# Altium footprint library PcbLib.PcbLib: 16 footprints
Each footprint in its own frame and in the unit in brackets; x right, y up, seen from the top. Pads: shape width x height; smd on the part's side, far side on the other; paste and mask are expansions set on the pad; w line width, h text height; cw(c..) or ccw(c..) is an arc to the next point about the centre after c.
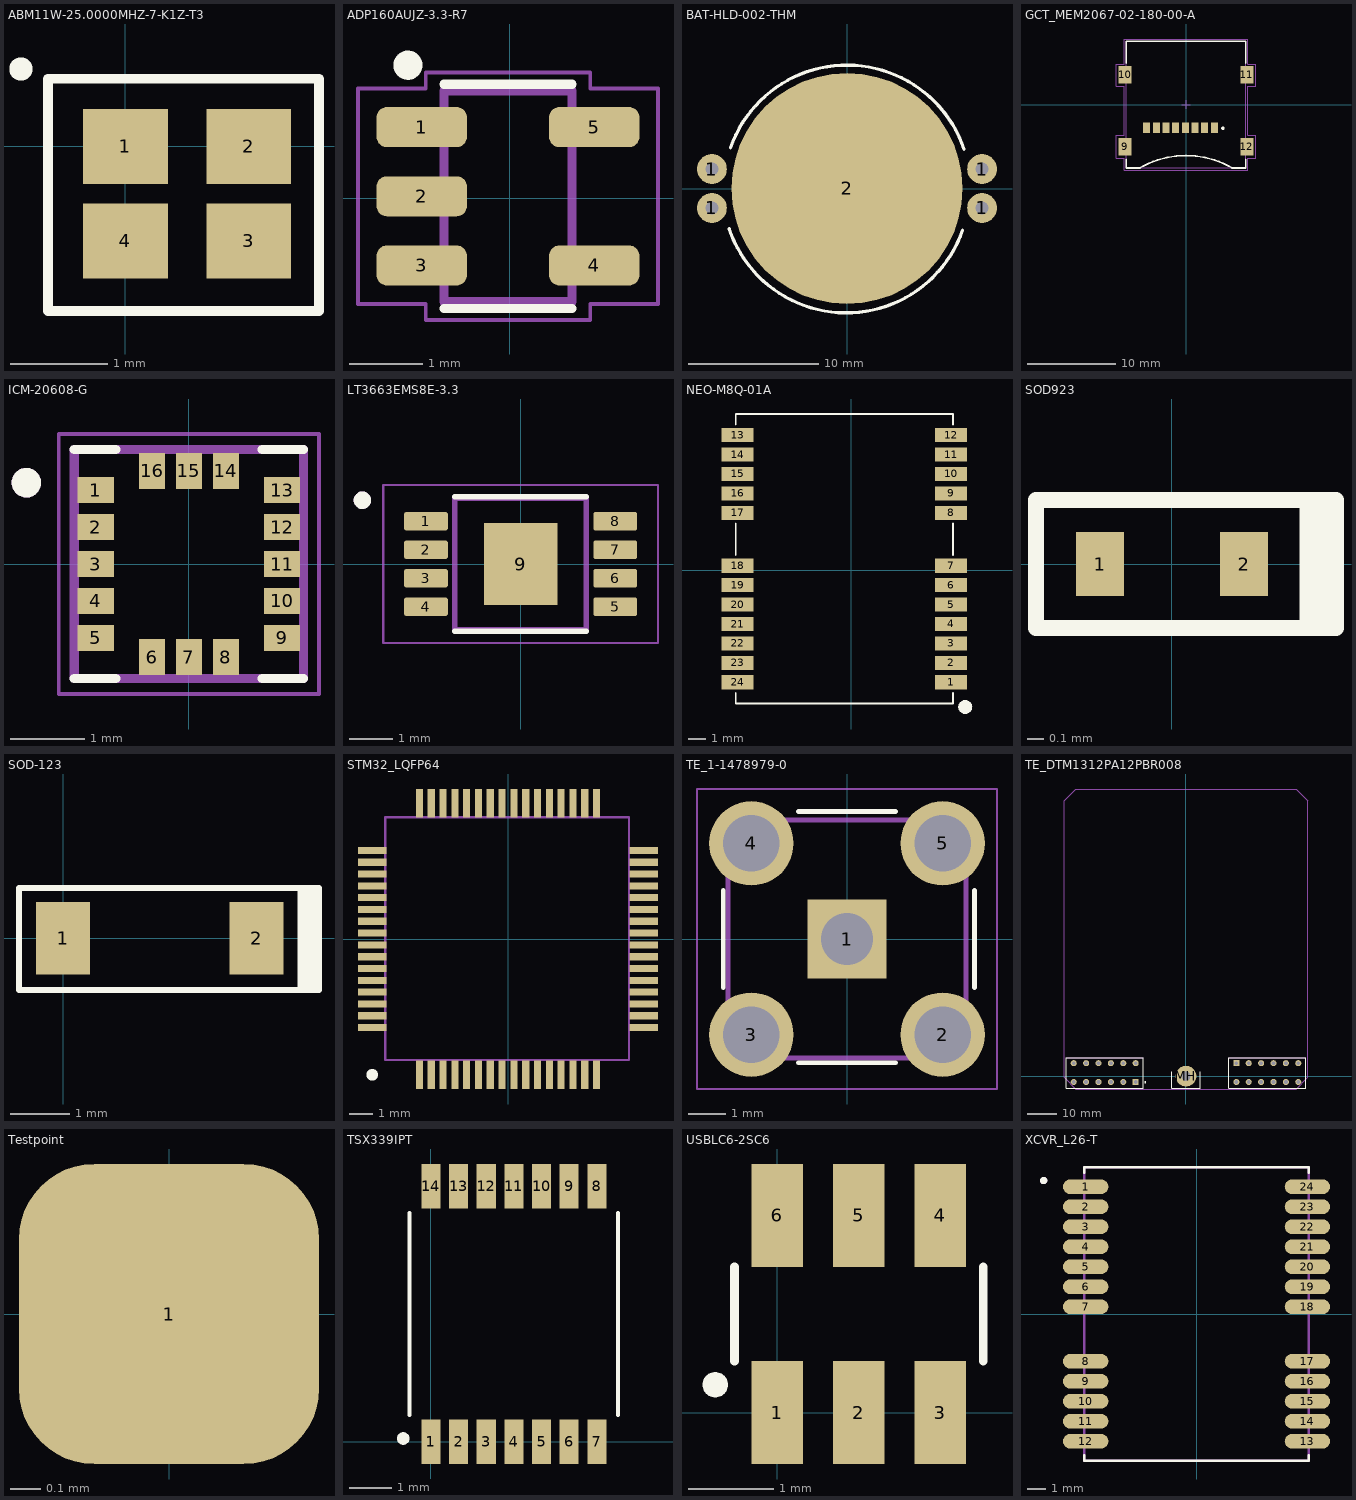
[diagram p0: the footprints below, top view; thin cyan lines are the x and y axes]

## ABM11W-25.0000MHZ-7-K1Z-T3 [mm] "Crystal"
pads (4):
  rect 0.875x0.775 smd: 1(0,0) 2(1.275,0) 3(1.275,-0.975) 4(0,-0.975)
Top Overlay:
  circle w0.2: c-1.08,0.8 r0.02
  lines w0.1: -0.8,-1.7 2,-1.7 2,0.7 -0.8,0.7 -0.8,-1.7

## ADP160AUJZ-3.3-R7 [mm] "Linear Voltage Regulator"
pads (5):
  rrect50% 1.24x0.55 smd: 1(-1.21,0.975) 2(-1.21,0.025) 3(-1.21,-0.925) 4(1.16,-0.925) 5(1.16,0.975)
Top Overlay:
  circle w0.2: c-1.4,1.825 r0.1
  lines w0.127: -0.905,-1.515 0.855,-1.515 ; -0.905,1.565 0.855,1.565
Mechanical 13:
  lines w0.127: -0.905,-1.425 -0.905,1.475 0.855,1.475 0.855,-1.425 -0.905,-1.425
Mechanical 15:
  lines w0.05: -2.085,-1.455 -1.155,-1.455 -1.155,-1.675 1.105,-1.675 1.105,-1.455 2.035,-1.455 2.035,1.505 1.105,1.505 1.105,1.725 -1.155,1.725 -1.155,1.505 -2.085,1.505 -2.085,-1.455
3D body "step_temp.STEP": height 0.85, standoff -0.15, extent -1.425,-1.425 1.375,1.475

## BAT-HLD-002-THM [mm] "Coin Cell"
pads (5):
  round 2.3 hole 1: 1(-10.4,-1.475) 1(-10.4,1.525) 1(10.4,-1.475) 1(10.4,1.525)
  round 17.8 smd: 2(0,0.025)
Top Overlay:
  lines w0.254: -9.078,-3.059 ccw(c-0.066,-0.055) 8.901,-3.193 ; -8.967,3.163 cw(c0,0.025) 9.012,3.029
3D body "BAT-HLD-002-THM--3DModel-STEP-56544.STEP": height 2.81, standoff -3.29, extent -10.532,-7.594 10.55,7.9

## GCT_MEM2067-02-180-00-A [mm] "Micro SD Card"
pads (12):
  rect 0.8x1.2 smd: 1(3.225,-2.625) 2(2.125,-2.625) 3(1.025,-2.625) 4(-0.075,-2.625) 5(-1.175,-2.625) 6(-2.275,-2.625) 7(-3.375,-2.625) 8(-4.475,-2.625)
  rect 1.5x2 smd: 9(-6.945,-4.825) 10(-6.945,3.375) 11(6.945,3.375) 12(6.945,-4.825)
Top Overlay:
  circle w0.2: c4.2,-2.7 r0.1
  lines w0.2: -6.8,-6.275 -6.8,-7.225 -5.25,-7.225 ; -6.8,4.725 -6.8,7.225 6.8,7.225 6.8,4.725 ; -5.226,-7.211 cw(c0,-16.264) 5.226,-7.211 ; 5.25,-7.225 6.8,-7.225 6.8,-6.275
Mechanical 13:
  lines w0.1: -6.8,2.77 -7.3,2.77 -7.3,3.97 -6.8,3.97 ; -0.5,0 0.5,0 ; 0,-0.5 0,0.5 ; -6.8,-5.4 -6.8,-7.225 6.8,-7.225 6.8,-5.4 ; -6.8,-5.4 -6.8,-4.2 ; -6.8,-5.4 -7.3,-5.4 -7.3,-4.2 -6.8,-4.2 ; -6.8,-4.2 -6.8,7.225 6.8,7.225 6.8,3.97 ; 6.8,-5.4 7.3,-5.4 7.3,-4.2 6.8,-4.2 ; 6.8,-5.4 6.8,-4.2 ; 6.8,-4.2 6.8,2.77 ; 6.8,2.77 7.3,2.77 7.3,3.97 6.8,3.97 ; 6.8,2.77 6.8,3.97
Mechanical 15:
  lines w0.05: -7.95,-6.096 -7.95,-3.505 -7.061,-3.505 -7.061,2.108 -7.95,2.108 -7.95,4.597 -7.061,4.597 -7.061,7.468 7.061,7.468 7.061,4.597 7.95,4.597 7.95,2.108 7.061,2.108 7.061,-3.505 7.95,-3.505 7.95,-6.096 7.061,-6.096 7.061,-7.468 -7.061,-7.468 -7.061,-6.096 -7.95,-6.096

## ICM-20608-G [mm]
pads (16):
  rect 0.49x0.35 smd: 1(-1.26,1) 2(-1.26,0.5) 3(-1.26,0) 4(-1.26,-0.5) 5(-1.26,-1) 9(1.26,-1) 10(1.26,-0.5) 11(1.26,0) 12(1.26,0.5) 13(1.26,1)
  rect 0.35x0.49 smd: 6(-0.5,-1.26) 7(0,-1.26) 8(0.5,-1.26) 14(0.5,1.26) 15(0,1.26) 16(-0.5,1.26)
Top Overlay:
  circle w0.2: c-2.2,1.1 r0.1
  lines w0.127: -1.55,-1.55 -0.99,-1.55 ; -1.55,1.55 -0.99,1.55 ; 0.99,-1.55 1.55,-1.55 ; 0.99,1.55 1.55,1.55
Mechanical 13:
  circle w0.2: c-2.2,1.1 r0.1
  lines w0.127: -1.55,-1.55 1.55,-1.55 1.55,1.55 -1.55,1.55 -1.55,-1.55
Mechanical 15:
  lines w0.05: -1.76,-1.76 1.76,-1.76 1.76,1.76 -1.76,1.76 -1.76,-1.76
3D body "step_temp.STEP": height 0.8, standoff 0, extent -1.5,-1.5 1.5,1.5

## LT3663EMS8E-3.3 [mm]
pads (9):
  rrect25% 1x0.42 smd: 1(-2.16,0.975) 2(-2.16,0.325) 3(-2.16,-0.325) 4(-2.16,-0.975) 5(2.16,-0.975) 6(2.16,-0.325) 7(2.16,0.325) 8(2.16,0.975)
  rect 1.68x1.88 smd paste-2: 9(0,0)
Top Overlay:
  circle w0.2: c-3.61,1.455 r0.1
  lines w0.127: -1.5,-1.535 1.5,-1.535 ; -1.5,1.535 1.5,1.535
Top Paste:
  region: 0.42,-0.47 -0.42,-0.47 -0.42,0.47 0.42,0.47
Mechanical 13:
  circle w0.2: c-3.61,1.455 r0.1
  lines w0.127: -1.5,-1.5 1.5,-1.5 1.5,1.5 -1.5,1.5 -1.5,-1.5
Mechanical 15:
  lines w0.05: -3.135,-1.801 3.135,-1.801 3.135,1.801 -3.135,1.801 -3.135,-1.801
3D body "step_temp.STEP": height 1.11, standoff 0.01, extent -2.45,-1.5 2.45,1.5

## NEO-M8Q-01A [mm] "GNSS Module"
pads (25):
  rect 1.8x0.8 smd: 1(5.65,-6.35) 2(5.65,-5.25) 3(5.65,-4.15) 4(5.65,-3.05) 5(5.65,-1.95) 6(5.65,-0.85) 7(5.65,0.25) 8(5.65,3.25) 9(5.65,4.35) 10(5.65,5.45) 11(5.65,6.55) 12(5.65,7.65) 13(-6.45,7.65) 14(-6.45,6.55) 15(-6.45,5.45) 16(-6.45,4.35) 17(-6.45,3.25) 18(-6.45,0.25) 19(-6.45,-0.85) 20(-6.45,-1.95) 21(-6.45,-3.05) 22(-6.45,-4.15) 23(-6.45,-5.25) 24(-6.45,-6.35)
  round 0.8 on Top Overlay: ""(6.45,-7.75)
Top Overlay:
  lines w0.1: -6.55,-6.95 -6.55,-7.55 5.75,-7.55 5.75,-6.95 ; -6.55,0.85 -6.55,2.65 ; -6.55,8.25 -6.55,8.85 5.75,8.85 5.75,8.25 ; 5.75,0.85 5.75,2.65
3D body "NEO-M8Q-01A.STEP": height 2.61, standoff 0.01, extent -6.5,-7.35 5.7,8.65

## SOD923 [mm]
pads (2):
  rect 0.3x0.4 smd: 1(-0.45,0) 2(0.45,0)
Top Overlay:
  region: 1.025,0.4 1.025,-0.4 0.8,-0.4 0.8,0.4
  lines w0.1: -0.85,-0.4 1.025,-0.4 1.025,0.4 -0.85,0.4 -0.85,0 -0.85,-0.4
3D body "User Library-DIODE_SOD-923.step": height 0.44, standoff 0.01, extent -0.55,-0.325 0.5,0.325

## SOD-123 [mm]
pads (2):
  rect 0.91x1.22 smd: 1(0,0) 2(3.27,0)
Top Overlay:
  region: 4.287,0.85 4.287,-0.875 3.962,-0.875 3.962,0.85
  lines w0.1: -0.745,-0.875 4.325,-0.875 4.325,0.85 -0.745,0.85 -0.745,-0.875
3D body "CircuitWorks-SOD123.step": height 1.28, standoff 0.01, extent -0.275,-0.825 3.425,0.775

## STM32_LQFP64 [mm]
pads (65):
  rect 0.3x1.2 smd: 1(-3.75,-5.75) 2(-3.25,-5.75) 3(-2.75,-5.75) 4(-2.25,-5.75) 5(-1.75,-5.75) 6(-1.25,-5.75) 7(-0.75,-5.75) 8(-0.25,-5.75) 9(0.25,-5.75) 10(0.75,-5.75) 11(1.25,-5.75) 12(1.75,-5.75) 13(2.25,-5.75) 14(2.75,-5.75) 15(3.25,-5.75) 16(3.75,-5.75) 33(3.75,5.75) 34(3.25,5.75) 35(2.75,5.75) 36(2.25,5.75) 37(1.75,5.75) 38(1.25,5.75) 39(0.75,5.75) 40(0.25,5.75) 41(-0.25,5.75) 42(-0.75,5.75) 43(-1.25,5.75) 44(-1.75,5.75) 45(-2.25,5.75) 46(-2.75,5.75) 47(-3.25,5.75) 48(-3.75,5.75)
  rect 1.2x0.3 smd: 17(5.75,-3.75) 18(5.75,-3.25) 19(5.75,-2.75) 20(5.75,-2.25) 21(5.75,-1.75) 22(5.75,-1.25) 23(5.75,-0.75) 24(5.75,-0.25) 25(5.75,0.25) 26(5.75,0.75) 27(5.75,1.25) 28(5.75,1.75) 29(5.75,2.25) 30(5.75,2.75) 31(5.75,3.25) 32(5.75,3.75) 49(-5.75,3.75) 50(-5.75,3.25) 51(-5.75,2.75) 52(-5.75,2.25) 53(-5.75,1.75) 54(-5.75,1.25) 55(-5.75,0.75) 56(-5.75,0.25) 57(-5.75,-0.25) 58(-5.75,-0.75) 59(-5.75,-1.25) 60(-5.75,-1.75) 61(-5.75,-2.25) 62(-5.75,-2.75) 63(-5.75,-3.25) 64(-5.75,-3.75)
  round 0.5 on Top Overlay: ""(-5.75,-5.75)
Mechanical 1:
  lines w0.1: -5.2,-5.125 5.125,-5.125 5.125,5.15 -3.675,5.15 -5.2,5.15 -5.2,-5.125
3D body "User Library-STM32Fxxx -LQFP64 10mm x 10mm.step": height 1.6, standoff 0.01, extent -5.999,-5.999 5.999,5.999

## TE_1-1478979-0 [mm]
pads (5):
  rect 2.1x2.1 hole 1.4: 1(0,0)
  round 2.25 hole 1.5: 2(2.55,-2.55) 3(-2.55,-2.55) 4(-2.55,2.55) 5(2.55,2.55)
Top Overlay:
  lines w0.127: -3.3,-1.3 -3.3,1.3 ; -1.3,-3.3 1.3,-3.3 ; -1.3,3.4 1.3,3.4 ; 3.4,-1.3 3.4,1.3
Mechanical 13:
  lines w0.127: -3.175,-3.175 -3.175,3.175 3.175,3.175 3.175,-3.175 -3.175,-3.175
Mechanical 15:
  lines w0.05: -4,-4 4,-4 4,4 -4,4 -4,-4
3D body "c-1053378-1-c-3d.stp": height 9.54, standoff -3.92, extent -3.175,-11.604 3.175,3.6

## TE_DTM1312PA12PBR008 [mm]
pads (25):
  rect 2.056x2.056 hole 1.294: A1(-17.02,-1.96) B1(17.02,4.39)
  round 2.056 hole 1.294: A2(-21.21,-1.96) A3(-25.4,-1.96) A4(-29.59,-1.96) A5(-33.78,-1.96) A6(-37.97,-1.96) A7(-37.97,4.39) A8(-33.78,4.39) A9(-29.59,4.39) A10(-25.4,4.39) A11(-21.21,4.39) A12(-17.02,4.39) B2(21.21,4.39) B3(25.4,4.39) B4(29.59,4.39) B5(33.78,4.39) B6(37.97,4.39) B7(37.97,-1.96) B8(33.78,-1.96) B9(29.59,-1.96) B10(25.4,-1.96) B11(21.21,-1.96) B12(17.02,-1.96)
  round 7 hole 3.1 unplated: MH(0,0)
Top Overlay:
  circle w0.4: c-13.75,-2.075 r0.2
  lines w0.1: -40.5,-4 -14.5,-4 ; -4.75,-4 4.75,-4 ; 14.5,-4 40.5,-4
  lines w0.127: -40.5,-4 -40.5,6.315 -14.5,6.315 -14.5,-4 ; -4.75,-4 -4.75,1.445 ; 4.75,-4 4.75,1.445 ; 14.5,-4 14.5,6.315 40.5,6.315 40.5,-4
Mechanical 13:
  lines w0.127: -40.5,6.315 -14.5,6.315 ; 14.5,6.315 40.5,6.315
  lines w0.15: -41.2,-0.335 -37.2,-4.335 37.2,-4.335 41.2,-0.335 41.2,93.115 37.2,97.115 -37.2,97.115 -41.2,93.115 -41.2,-0.335
3D body "c-dtm1312pa12pbgr01-c-3d.stp": height 25.72, standoff -9.28, extent -54.153,-30.7 54.153,6.206

## Testpoint [mm]
pads (1):
  rrect50% 1x1 smd: 1(0,0)

## TSX339IPT [mm] "4 Channel Comparator"
pads (15):
  rect 0.45x1.05 smd: 1(0,0) 2(0.65,0) 3(1.3,0) 4(1.95,0) 5(2.6,0) 6(3.25,0) 7(3.9,0) 8(3.9,6) 9(3.25,6) 10(2.6,6) 11(1.95,6) 12(1.3,6) 13(0.65,6) 14(0,6)
  round 0.3 on Top Overlay: ""(-0.65,0.075)
Top Overlay:
  lines w0.1: -0.5,0.625 -0.5,5.375 ; 4.4,0.625 4.4,5.375
3D body "User Library-TSSOP14-1.step": height 1.1, standoff 0, extent -0.55,-0.15 4.45,6.25

## USBLC6-2SC6 [mm] "SOT-23-6"
pads (7):
  rect 0.6x1.2 smd: 1(0,0) 2(0.95,0) 3(1.9,0) 4(1.9,2.3) 5(0.95,2.3) 6(0,2.3)
  round 0.3 on Top Overlay: ""(-0.725,0.325)
Top Overlay:
  lines w0.1: -0.5,0.6 -0.5,1.7 ; 2.4,0.6 2.4,1.7
3D body "usblc6-2sc6y.stp": height 1.18, standoff 0, extent -0.498,-0.225 2.398,2.575

## XCVR_L26-T [mm]
pads (24):
  oval 2.5x0.8 smd paste-2: 1(-6.1,7) 2(-6.1,5.9) 3(-6.1,4.8) 4(-6.1,3.7) 5(-6.1,2.6) 6(-6.1,1.5) 7(-6.1,0.4) 8(-6.1,-2.6) 9(-6.1,-3.7) 10(-6.1,-4.8) 11(-6.1,-5.9) 12(-6.1,-7) 13(6.1,-7) 14(6.1,-5.9) 15(6.1,-4.8) 16(6.1,-3.7) 17(6.1,-2.6) 18(6.1,0.4) 19(6.1,1.5) 20(6.1,2.6) 21(6.1,3.7) 22(6.1,4.8) 23(6.1,5.9) 24(6.1,7)
Top Overlay:
  circle w0.2: c-8.41,7.34 r0.1
  lines w0.127: -6.175,-7.75 -6.175,-8.075 6.175,-8.075 6.175,-7.75 ; -6.175,7.75 -6.175,8.075 6.175,8.075 6.175,7.75
Mechanical 13:
  circle w0.2: c-8.41,7.34 r0.1
  lines w0.127: -6.175,-8.075 6.175,-8.075 6.175,8.075 -6.175,8.075 -6.175,-8.075
3D body "step_temp.STEP": height 2.41, standoff 0.01, extent -6.085,-7.995 6.115,8.005